# Altium footprint library ParsaLibrary.PcbLib: 526 footprints (part 19 of 33)
Each footprint in its own frame and in the unit in brackets; x right, y up, seen from the top. Pads: shape width x height; smd on the part's side, far side on the other; paste and mask are expansions set on the pad; w line width, h text height; cw(c..) or ccw(c..) is an arc to the next point about the centre after c.
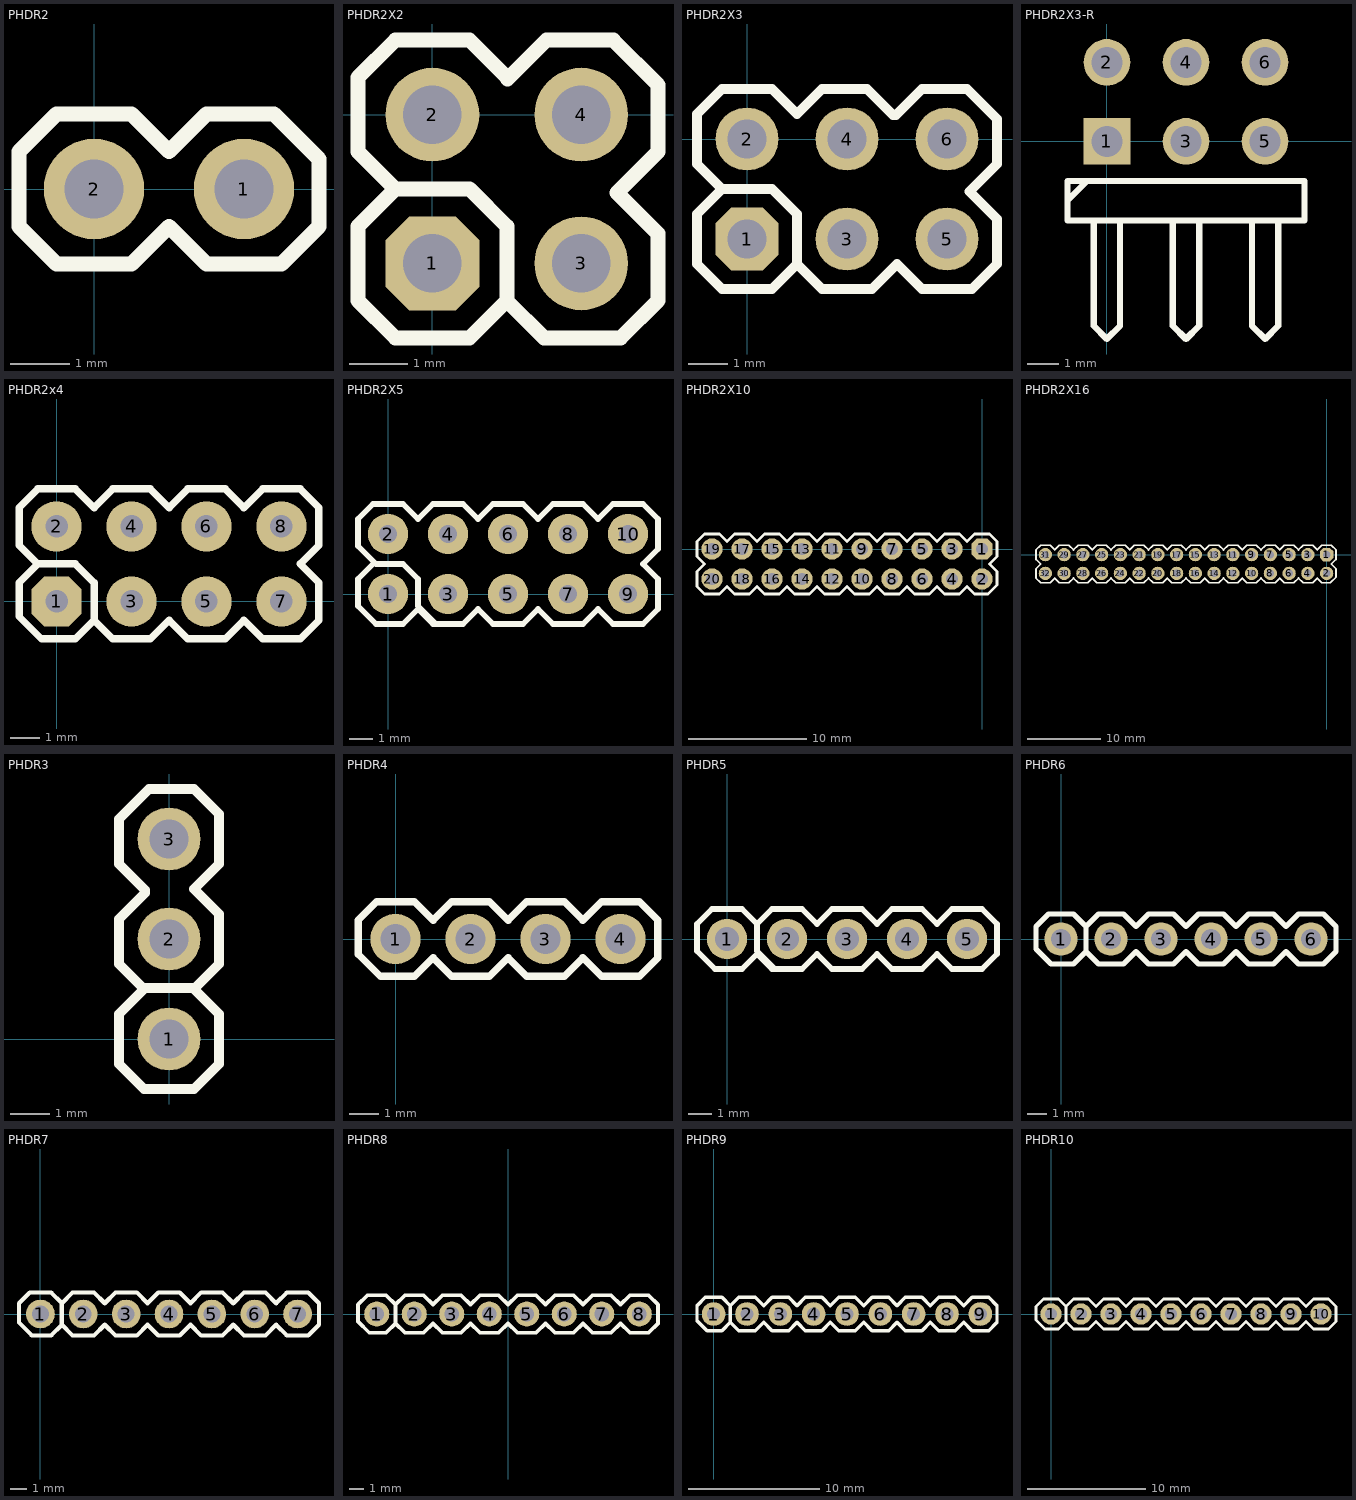
[diagram p18: the footprints below, top view; thin cyan lines are the x and y axes]

## PHDR2 [mm] "Pin Header 2 M"
pads (2):
  round 1.7 hole 1: 1(2.54,0) 2(0,0)
Top Overlay:
  lines w0.254: -1.27,-0.635 -1.27,0.635 -0.635,1.27 0,1.27 0.635,1.27 1.27,0.635 1.905,1.27 3.048,1.27 3.81,0.508 3.81,-0.635 3.175,-1.27 1.905,-1.27 1.27,-0.635 0.635,-1.27 -0.635,-1.27 -1.27,-0.635
3D body "jumper.STEP": height 8.39, standoff -2.53, extent -1.244,-1.295 3.836,1.245

## PHDR2X2 [mm]
pads (4):
  oct 1.6x1.6 hole 1: 1(0,-2.54)
  round 1.6 hole 1: 2(0,0) 3(2.54,-2.54) 4(2.54,0)
Top Overlay:
  lines w0.254: 1.27,0.635 0.635,1.27 0,1.27 -0.635,1.27 -1.27,0.635 -1.27,-0.635 -0.635,-1.27 ; 1.285,0.61 1.945,1.27 3.088,1.27 3.85,0.508 3.85,-0.635 3.151,-1.333 3.85,-2.032 3.85,-3.175 3.215,-3.81 1.945,-3.81 ; 1.905,-3.81 1.27,-3.175 ; -0.635,-1.27 -1.27,-1.905 -1.27,-3.175 -0.635,-3.81 0.635,-3.81 1.27,-3.175 ; -0.635,-1.27 0.635,-1.27 1.27,-1.905 1.27,-3.175
3D body "jumper.STEP": height 8.39, standoff -2.53, extent -1.27,-3.81 1.27,1.27
3D body "jumper.STEP": height 8.39, standoff -2.53, extent 1.27,-3.81 3.81,1.27

## PHDR2X3 [mm]
pads (6):
  oct 1.6x1.6 hole 1: 1(0,-2.54)
  round 1.6 hole 1: 2(0,0) 3(2.54,-2.54) 4(2.54,0) 5(5.08,-2.54) 6(5.08,0)
Top Overlay:
  lines w0.254: -0.635,-1.27 -1.27,-0.635 -1.27,0.635 -0.635,1.27 0,1.27 0.635,1.27 1.27,0.635 1.905,1.27 3.048,1.27 3.708,0.61 3.785,0.61 4.445,1.27 5.588,1.27 6.35,0.508 6.35,-0.635 5.651,-1.333 6.35,-2.032 6.35,-3.175 5.715,-3.81 4.445,-3.81 3.81,-3.175 3.175,-3.81 1.905,-3.81 1.27,-3.175 ; -0.635,-1.27 -1.27,-1.905 -1.27,-3.175 -0.635,-3.81 0.635,-3.81 1.27,-3.175 ; -0.635,-1.27 0.635,-1.27 1.27,-1.905 1.27,-3.175
3D body "jumper.STEP": height 8.39, standoff -2.53, extent -1.27,-3.81 1.27,1.27
3D body "jumper.STEP": height 8.39, standoff -2.53, extent 1.27,-3.81 3.81,1.27
3D body "jumper.STEP": height 8.39, standoff -2.53, extent 3.81,-3.81 6.35,1.27

## PHDR2X3-R [mm]
pads (6):
  rect 1.5x1.5 hole 1: 1(0,0)
  round 1.5 hole 1: 2(0,2.54) 3(2.54,0) 4(2.54,2.54) 5(5.08,0) 6(5.08,2.54)
Top Overlay:
  lines w0.2: -1.27,-1.905 -0.635,-1.27 ; -0.423,-2.54 -0.423,-5.927 0,-6.35 0.423,-5.927 0.423,-2.54 ; 2.117,-2.54 2.117,-5.927 2.54,-6.35 2.963,-5.927 2.963,-2.54 ; 4.657,-2.54 4.657,-5.927 5.08,-6.35 5.503,-5.927 5.503,-2.54 ; -1.27,-2.54 -1.27,-1.27 6.35,-1.27 6.35,-2.54 -1.27,-2.54
3D body "12544.stp": height 5.55, standoff -3.2, extent -1.27,-9.61 6.35,2.845

## PHDR2x4 [mm]
pads (8):
  oct 1.7x1.7 hole 0.762: 1(0,0)
  round 1.7 hole 0.762: 2(0,2.54) 3(2.54,0) 4(2.54,2.54) 5(5.08,0) 6(5.08,2.54) 7(7.62,0) 8(7.62,2.54)
Top Overlay:
  lines w0.254: -0.635,1.27 0.635,1.27 1.27,0.635 1.27,-0.635 ; -0.635,1.27 -1.27,0.635 -1.27,-0.508 -0.508,-1.27 0.635,-1.27 1.27,-0.635 ; -0.635,1.27 -1.27,1.905 -1.27,3.175 -0.635,3.81 0.635,3.81 1.27,3.175 1.905,3.81 3.175,3.81 3.81,3.175 4.445,3.81 5.715,3.81 6.35,3.175 6.985,3.81 8.255,3.81 8.89,3.175 8.89,1.905 8.255,1.27 8.89,0.635 8.89,-0.635 8.255,-1.27 7.62,-1.27 6.985,-1.27 6.35,-0.635 5.715,-1.27 5.08,-1.27 4.445,-1.27 3.81,-0.635 3.175,-1.27 2.54,-1.27 1.905,-1.27 1.27,-0.635
3D body "2pinheader.STEP": height 8.38, standoff -2.54, extent -1.27,-1.27 3.81,1.27
3D body "2pinheader.STEP": height 8.38, standoff -2.54, extent 3.81,-1.27 8.89,1.27
3D body "2pinheader.STEP": height 8.38, standoff -2.54, extent 3.81,1.27 8.89,3.81
3D body "2pinheader.STEP": height 8.38, standoff -2.54, extent -1.27,1.27 3.81,3.81

## PHDR2X5 [mm]
pads (10):
  round 1.7 hole 0.762: 1(0,0) 2(0,2.54) 3(2.54,0) 4(2.54,2.54) 5(5.08,0) 6(5.08,2.54) 7(7.62,0) 8(7.62,2.54) 9(10.16,0) 10(10.16,2.54)
Top Overlay:
  lines w0.254: -0.635,1.27 -1.27,0.635 -1.27,-0.508 -0.508,-1.27 0.635,-1.27 1.27,-0.635 1.905,-1.27 2.54,-1.27 3.175,-1.27 ; 1.27,3.175 0.635,3.81 -0.635,3.81 -1.27,3.175 -1.27,2.032 -0.508,1.27 0.635,1.27 1.27,0.635 1.27,-0.508 2.032,-1.27 3.175,-1.27 ; 1.27,3.175 1.905,3.81 ; 1.27,3.175 1.905,3.81 ; 1.905,3.81 3.175,3.81 ; 1.905,3.81 3.175,3.81 ; 3.175,-1.27 3.81,-0.635 ; 3.175,-1.27 3.81,-0.635 ; 3.175,3.81 3.81,3.175 ; 3.175,3.81 3.81,3.175 ; 3.81,-0.635 4.445,-1.27 ; 3.81,-0.635 4.445,-1.27 ; 3.81,3.175 4.445,3.81 ; 3.81,3.175 4.445,3.81 ; 4.445,-1.27 5.08,-1.27 5.715,-1.27 ; 4.445,3.81 5.715,3.81 ; 5.715,-1.27 6.35,-0.635 ; 5.715,-1.27 6.35,-0.635 ; 5.715,3.81 6.35,3.175 ; 5.715,3.81 6.35,3.175 ; 6.35,-0.635 6.985,-1.27 ; 6.35,-0.635 6.985,-1.27 ; 6.35,3.175 6.985,3.81 ; 6.35,3.175 6.985,3.81 ; 6.985,-1.27 7.62,-1.27 ; 6.985,-1.27 7.62,-1.27 ; 6.985,3.81 8.255,3.81 ; 6.985,3.81 8.255,3.81 ; 7.62,-1.27 8.255,-1.27 ; 7.62,-1.27 8.255,-1.27 ; 8.255,-1.27 8.89,-0.635 ; 8.255,-1.27 8.89,-0.635 ; 8.255,3.81 8.89,3.175 ; 8.255,3.81 8.89,3.175 ; 8.89,-0.635 9.525,-1.27 10.16,-1.27 10.795,-1.27 11.43,-0.635 11.43,0.635 10.795,1.27 11.43,1.905 11.43,3.175 10.795,3.81 9.525,3.81 8.89,3.175
3D body "2pinheader.STEP": height 8.38, standoff -2.54, extent -1.27,-1.27 1.27,3.81
3D body "2pinheader.STEP": height 8.38, standoff -2.54, extent 1.27,-1.27 3.81,3.81
3D body "2pinheader.STEP": height 8.38, standoff -2.54, extent 3.81,-1.27 6.35,3.81
3D body "2pinheader.STEP": height 8.38, standoff -2.54, extent 6.35,-1.27 8.89,3.81
3D body "2pinheader.STEP": height 8.38, standoff -2.54, extent 8.89,-1.27 11.43,3.81

## PHDR2X10 [mm]
pads (20):
  oct 1.8x1.8 hole 1: 1(0,0)
  round 1.8 hole 1: 2(0,-2.54) 3(-2.54,0) 4(-2.54,-2.54) 5(-5.08,0) 6(-5.08,-2.54) 7(-7.62,0) 8(-7.62,-2.54) 9(-10.16,0) 10(-10.16,-2.54) 11(-12.7,0) 12(-12.7,-2.54) 13(-15.24,0) 14(-15.24,-2.54) 15(-17.78,0) 16(-17.78,-2.54) 17(-20.32,0) 18(-20.32,-2.54) 19(-22.86,0) 20(-22.86,-2.54)
Top Overlay:
  lines w0.254: -15.24,-3.81 -14.605,-3.81 -13.97,-3.175 -13.335,-3.81 -12.7,-3.81 ; -14.732,-3.81 -15.875,-3.81 -16.51,-3.175 -17.145,-3.81 -17.78,-3.81 ; -5.08,-3.81 -4.445,-3.81 -3.81,-3.175 -3.175,-3.81 -2.54,-3.81 -1.905,-3.81 -1.27,-3.175 -0.635,-3.81 0.508,-3.81 1.27,-3.048 1.27,-1.905 0.635,-1.27 1.27,-0.635 1.27,0.635 0.635,1.27 -0.635,1.27 -1.27,0.635 -1.905,1.27 -3.175,1.27 -3.81,0.635 -4.445,1.27 -5.715,1.27 -6.35,0.635 -6.985,1.27 -8.255,1.27 -8.89,0.635 -9.525,1.27 -10.795,1.27 -11.43,0.635 -12.065,1.27 -13.335,1.27 -13.97,0.635 -14.605,1.27 -15.875,1.27 -16.51,0.635 -17.145,1.27 -18.415,1.27 -19.05,0.635 -19.685,1.27 -20.955,1.27 -21.59,0.635 -22.225,1.27 -23.495,1.27 -24.13,0.635 -24.13,-0.635 -23.495,-1.27 -24.13,-1.905 -24.13,-3.175 -23.495,-3.81 -22.86,-3.81 -22.225,-3.81 -21.59,-3.175 -20.955,-3.81 -20.32,-3.81 -19.685,-3.81 -19.05,-3.175 -18.415,-3.81 ; -4.572,-3.81 -5.715,-3.81 -6.35,-3.175 -6.985,-3.81 -7.62,-3.81 ; -18.415,-3.81 -17.78,-3.81 ; -18.415,-3.81 -17.78,-3.81 ; -12.7,-3.81 -12.065,-3.81 ; -12.7,-3.81 -12.065,-3.81 ; -12.065,-3.81 -11.43,-3.175 -10.795,-3.81 -10.16,-3.81 -9.525,-3.81 -8.89,-3.175 -8.255,-3.81 ; -8.255,-3.81 -7.62,-3.81 ; -8.255,-3.81 -7.62,-3.81
3D body "2pinheader.STEP": height 2.54, standoff -8.38, extent -24.13,-3.81 -19.05,-1.27
3D body "2pinheader.STEP": height 2.54, standoff -8.38, extent -19.05,-3.81 -13.97,-1.27
3D body "2pinheader.STEP": height 2.54, standoff -8.38, extent -13.97,-3.81 -8.89,-1.27
3D body "2pinheader.STEP": height 2.54, standoff -8.38, extent -8.89,-3.81 -3.81,-1.27
3D body "2pinheader.STEP": height 2.54, standoff -8.38, extent -3.81,-3.81 1.27,-1.27
3D body "2pinheader.STEP": height 2.54, standoff -8.38, extent -3.81,-1.27 1.27,1.27
3D body "2pinheader.STEP": height 2.54, standoff -8.38, extent -8.89,-1.27 -3.81,1.27
3D body "2pinheader.STEP": height 2.54, standoff -8.38, extent -13.97,-1.27 -8.89,1.27
3D body "2pinheader.STEP": height 2.54, standoff -8.38, extent -19.05,-1.27 -13.97,1.27
3D body "2pinheader.STEP": height 2.54, standoff -8.38, extent -24.13,-1.27 -19.05,1.27

## PHDR2X16 [mm]
pads (32):
  oct 1.8x1.8 hole 1: 1(0,0)
  round 1.8 hole 1: 2(0,-2.54) 3(-2.54,0) 4(-2.54,-2.54) 5(-5.08,0) 6(-5.08,-2.54) 7(-7.62,0) 8(-7.62,-2.54) 9(-10.16,0) 10(-10.16,-2.54) 11(-12.7,0) 12(-12.7,-2.54) 13(-15.24,0) 14(-15.24,-2.54) 15(-17.78,0) 16(-17.78,-2.54) 17(-20.32,0) 18(-20.32,-2.54) 19(-22.86,0) 20(-22.86,-2.54) 21(-25.4,0) 22(-25.4,-2.54) 23(-27.94,0) 24(-27.94,-2.54) 25(-30.48,0) 26(-30.48,-2.54) 27(-33.02,0) 28(-33.02,-2.54) 29(-35.56,0) 30(-35.56,-2.54) 31(-38.1,0) 32(-38.1,-2.54)
Top Overlay:
  lines w0.254: -15.24,-3.81 -14.605,-3.81 -13.97,-3.175 -13.335,-3.81 -12.7,-3.81 ; -14.732,-3.81 -15.875,-3.81 -16.51,-3.175 -17.145,-3.81 -17.78,-3.81 ; -5.08,-3.81 -4.445,-3.81 -3.81,-3.175 -3.175,-3.81 -2.54,-3.81 -1.905,-3.81 -1.27,-3.175 -0.635,-3.81 0.508,-3.81 1.27,-3.048 1.27,-1.905 0.635,-1.27 1.27,-0.635 1.27,0.635 0.635,1.27 -0.635,1.27 -1.27,0.635 -1.905,1.27 -3.175,1.27 -3.81,0.635 -4.445,1.27 -5.715,1.27 -6.35,0.635 -6.985,1.27 -8.255,1.27 -8.89,0.635 -9.525,1.27 -10.795,1.27 -11.43,0.635 -12.065,1.27 -13.335,1.27 -13.97,0.635 -14.605,1.27 -15.875,1.27 -16.51,0.635 -17.145,1.27 -18.415,1.27 -19.05,0.635 -19.685,1.27 -20.955,1.27 -21.59,0.635 -22.225,1.27 -23.495,1.27 ; -4.572,-3.81 -5.715,-3.81 -6.35,-3.175 -6.985,-3.81 -7.62,-3.81 ; -26.67,-3.175 -27.305,-3.81 -27.94,-3.81 -28.575,-3.81 -29.21,-3.175 -29.845,-3.81 -30.48,-3.81 -31.115,-3.81 -31.75,-3.175 -32.385,-3.81 -33.02,-3.81 -33.655,-3.81 -34.29,-3.175 -34.925,-3.81 -35.56,-3.81 -36.195,-3.81 -36.83,-3.175 -37.465,-3.81 -38.1,-3.81 -38.735,-3.81 -39.37,-3.175 -39.37,-1.905 -38.735,-1.27 -39.37,-0.635 -39.37,0.635 -38.735,1.27 -37.465,1.27 -36.83,0.635 -36.195,1.27 -34.925,1.27 -34.29,0.635 -33.655,1.27 -32.385,1.27 -31.75,0.635 -31.115,1.27 -29.845,1.27 -29.21,0.635 -28.575,1.27 -27.305,1.27 -26.67,0.635 ; -26.67,-3.175 -26.035,-3.81 ; -26.67,-3.175 -26.035,-3.81 ; -26.67,0.635 -26.035,1.27 ; -26.67,0.635 -26.035,1.27 ; -26.035,-3.81 -25.4,-3.81 -24.765,-3.81 -24.13,-3.175 ; -26.035,1.27 -24.765,1.27 -24.13,0.635 ; -24.13,-3.175 -23.495,-3.81 ; -24.13,-3.175 -23.495,-3.81 ; -24.13,0.635 -23.495,1.27 ; -24.13,0.635 -23.495,1.27 ; -23.495,-3.81 -22.86,-3.81 -22.225,-3.81 -21.59,-3.175 -20.955,-3.81 -20.32,-3.81 -19.685,-3.81 -19.05,-3.175 -18.415,-3.81 ; -18.415,-3.81 -17.78,-3.81 ; -18.415,-3.81 -17.78,-3.81 ; -12.7,-3.81 -12.065,-3.81 ; -12.7,-3.81 -12.065,-3.81 ; -12.065,-3.81 -11.43,-3.175 -10.795,-3.81 -10.16,-3.81 -9.525,-3.81 -8.89,-3.175 -8.255,-3.81 ; -8.255,-3.81 -7.62,-3.81 ; -8.255,-3.81 -7.62,-3.81
3D body "2pinheader.STEP": height 2.54, standoff -8.38, extent -24.13,-1.27 -19.05,1.27
3D body "2pinheader.STEP": height 2.54, standoff -8.38, extent -19.05,-1.27 -13.97,1.27
3D body "2pinheader.STEP": height 2.54, standoff -8.38, extent -13.97,-1.27 -8.89,1.27
3D body "2pinheader.STEP": height 2.54, standoff -8.38, extent -8.89,-1.27 -3.81,1.27
3D body "2pinheader.STEP": height 2.54, standoff -8.38, extent -3.81,-1.27 1.27,1.27
3D body "2pinheader.STEP": height 2.54, standoff -8.38, extent -3.81,-3.81 1.27,-1.27
3D body "2pinheader.STEP": height 2.54, standoff -8.38, extent -8.89,-3.81 -3.81,-1.27
3D body "2pinheader.STEP": height 2.54, standoff -8.38, extent -13.97,-3.81 -8.89,-1.27
3D body "2pinheader.STEP": height 2.54, standoff -8.38, extent -19.05,-3.81 -13.97,-1.27
3D body "2pinheader.STEP": height 2.54, standoff -8.38, extent -24.13,-3.81 -19.05,-1.27
3D body "2pinheader.STEP": height 2.54, standoff -8.38, extent -29.21,-3.81 -24.13,-1.27
3D body "2pinheader.STEP": height 2.54, standoff -8.38, extent -29.21,-1.27 -24.13,1.27
3D body "2pinheader.STEP": height 2.54, standoff -8.38, extent -34.29,-3.81 -29.21,-1.27
3D body "2pinheader.STEP": height 2.54, standoff -8.38, extent -34.29,-1.27 -29.21,1.27
3D body "2pinheader.STEP": height 2.54, standoff -8.38, extent -39.37,-3.81 -34.29,-1.27
3D body "2pinheader.STEP": height 2.54, standoff -8.38, extent -39.37,-1.27 -34.29,1.27

## PHDR3 [mm]
pads (3):
  round 1.6 hole 1: 1(0,0) 2(0,2.54) 3(0,5.08)
Top Overlay:
  lines w0.254: -0.61,1.295 0.66,1.295 ; -1.27,-0.635 -1.27,0 -1.27,0.635 -0.635,1.27 -1.27,1.905 -1.27,3.048 -0.61,3.708 -0.61,3.785 -1.27,4.445 -1.27,5.588 -0.508,6.35 0.635,6.35 1.27,5.715 1.27,4.445 0.635,3.81 1.27,3.175 1.27,1.905 0.635,1.27 1.27,0.635 1.27,-0.635 0.635,-1.27 -0.635,-1.27 -1.27,-0.635
3D body "jumper.STEP": height 8.39, standoff -2.53, extent -1.27,-1.27 1.27,3.81
3D body "jumper.STEP": height 8.39, standoff -2.53, extent -1.27,1.27 1.27,6.35

## PHDR4 [mm]
pads (4):
  round 1.7 hole 1: 1(0,0) 2(2.54,0) 3(5.08,0) 4(7.62,0)
Top Overlay:
  lines w0.254: -1.27,-0.508 -1.27,0.635 -0.635,1.27 0.635,1.27 1.27,0.635 1.905,1.27 3.175,1.27 3.81,0.635 4.445,1.27 5.715,1.27 6.35,0.635 6.985,1.27 8.255,1.27 8.89,0.635 8.89,-0.635 8.255,-1.27 7.62,-1.27 6.985,-1.27 6.35,-0.635 5.715,-1.27 5.08,-1.27 4.445,-1.27 3.81,-0.635 3.175,-1.27 2.54,-1.27 1.905,-1.27 1.27,-0.635 0.635,-1.27 -0.508,-1.27 -1.27,-0.508
3D body "2pinheader.STEP": height 8.38, standoff -2.54, extent -1.27,-1.27 3.81,1.27
3D body "2pinheader.STEP": height 8.38, standoff -2.54, extent 3.81,-1.27 8.89,1.27

## PHDR5 [mm]
pads (5):
  round 1.7 hole 1: 1(0,0) 2(2.54,0) 3(5.08,0) 4(7.62,0) 5(10.16,0)
Top Overlay:
  lines w0.254: 1.27,0.635 0.635,1.27 -0.635,1.27 -1.27,0.635 -1.27,-0.508 -0.508,-1.27 0.635,-1.27 1.27,-0.635 1.905,-1.27 2.54,-1.27 3.175,-1.27 ; 1.27,0.635 1.905,1.27 ; 1.27,0.635 1.27,-0.508 2.032,-1.27 3.175,-1.27 ; 1.27,0.635 1.905,1.27 ; 1.905,1.27 3.175,1.27 ; 1.905,1.27 3.175,1.27 ; 3.175,-1.27 3.81,-0.635 ; 3.175,-1.27 3.81,-0.635 ; 3.175,1.27 3.81,0.635 ; 3.175,1.27 3.81,0.635 ; 3.81,-0.635 4.445,-1.27 ; 3.81,-0.635 4.445,-1.27 ; 3.81,0.635 4.445,1.27 ; 3.81,0.635 4.445,1.27 ; 4.445,-1.27 5.08,-1.27 5.715,-1.27 ; 4.445,1.27 5.715,1.27 ; 5.715,-1.27 6.35,-0.635 ; 5.715,-1.27 6.35,-0.635 ; 5.715,1.27 6.35,0.635 ; 5.715,1.27 6.35,0.635 ; 6.35,-0.635 6.985,-1.27 ; 6.35,-0.635 6.985,-1.27 ; 6.35,0.635 6.985,1.27 ; 6.35,0.635 6.985,1.27 ; 6.985,-1.27 7.62,-1.27 ; 6.985,-1.27 7.62,-1.27 ; 6.985,1.27 8.255,1.27 ; 6.985,1.27 8.255,1.27 ; 7.62,-1.27 8.255,-1.27 ; 7.62,-1.27 8.255,-1.27 ; 8.255,-1.27 8.89,-0.635 ; 8.255,-1.27 8.89,-0.635 ; 8.255,1.27 8.89,0.635 ; 8.255,1.27 8.89,0.635 ; 8.89,-0.635 9.525,-1.27 10.16,-1.27 10.795,-1.27 11.43,-0.635 11.43,0.635 10.795,1.27 9.525,1.27 8.89,0.635

## PHDR6 [mm]
pads (6):
  round 1.7 hole 1: 1(0,0) 2(2.54,0) 3(5.08,0) 4(7.62,0) 5(10.16,0) 6(12.7,0)
Top Overlay:
  lines w0.254: 4.572,-1.27 5.715,-1.27 6.35,-0.635 6.985,-1.27 7.62,-1.27 ; 5.08,-1.27 4.445,-1.27 3.81,-0.635 3.175,-1.27 2.54,-1.27 1.905,-1.27 1.27,-0.635 ; 1.27,-0.635 1.27,0.635 ; 1.27,-0.635 0.635,-1.27 -0.508,-1.27 -1.27,-0.508 -1.27,0.635 -0.635,1.27 0.635,1.27 1.27,0.635 ; 1.27,0.635 1.905,1.27 3.175,1.27 3.81,0.635 4.445,1.27 5.715,1.27 6.35,0.635 6.985,1.27 8.255,1.27 8.89,0.635 9.525,1.27 10.795,1.27 11.43,0.635 12.065,1.27 13.335,1.27 13.97,0.635 13.97,-0.635 13.335,-1.27 12.7,-1.27 12.065,-1.27 11.43,-0.635 10.795,-1.27 10.16,-1.27 9.525,-1.27 8.89,-0.635 8.255,-1.27 ; 7.62,-1.27 8.255,-1.27 ; 7.62,-1.27 8.255,-1.27
3D body "2pinheader.STEP": height 8.38, standoff -2.54, extent -1.27,-1.27 3.81,1.27
3D body "2pinheader.STEP": height 8.38, standoff -2.54, extent 3.81,-1.27 8.89,1.27
3D body "2pinheader.STEP": height 8.38, standoff -2.54, extent 8.89,-1.27 13.97,1.27

## PHDR7 [mm]
pads (7):
  round 1.7 hole 1: 1(0,0) 2(2.54,0) 3(5.08,0) 4(7.62,0) 5(10.16,0) 6(12.7,0) 7(15.24,0)
Top Overlay:
  lines w0.254: 4.572,-1.27 5.715,-1.27 6.35,-0.635 6.985,-1.27 7.62,-1.27 ; 5.08,-1.27 4.445,-1.27 3.81,-0.635 3.175,-1.27 2.54,-1.27 1.905,-1.27 1.27,-0.635 ; 1.27,-0.635 0.635,-1.27 -0.508,-1.27 -1.27,-0.508 -1.27,0.635 -0.635,1.27 0.635,1.27 1.27,0.635 ; 1.27,-0.635 1.27,0.635 ; 1.27,0.635 1.905,1.27 3.175,1.27 3.81,0.635 4.445,1.27 5.715,1.27 6.35,0.635 6.985,1.27 8.255,1.27 8.89,0.635 9.525,1.27 10.795,1.27 11.43,0.635 12.065,1.27 13.335,1.27 13.97,0.635 14.605,1.27 15.875,1.27 16.51,0.635 16.51,-0.635 15.875,-1.27 15.24,-1.27 14.605,-1.27 13.97,-0.635 13.335,-1.27 12.7,-1.27 12.065,-1.27 11.43,-0.635 10.795,-1.27 10.16,-1.27 9.525,-1.27 8.89,-0.635 8.255,-1.27 ; 7.62,-1.27 8.255,-1.27 ; 7.62,-1.27 8.255,-1.27
3D body "2pinheader.STEP": height 8.38, standoff -2.54, extent 11.43,-1.27 16.51,1.27
3D body "2pinheader.STEP": height 8.38, standoff -2.54, extent 8.89,-1.27 13.97,1.27
3D body "2pinheader.STEP": height 8.38, standoff -2.54, extent 3.81,-1.27 8.89,1.27
3D body "2pinheader.STEP": height 8.38, standoff -2.54, extent -1.27,-1.27 3.81,1.27

## PHDR8 [mm]
pads (8):
  round 1.7 hole 1: 1(-8.89,0) 2(-6.35,0) 3(-3.81,0) 4(-1.27,0) 5(1.27,0) 6(3.81,0) 7(6.35,0) 8(8.89,0)
Top Overlay:
  lines w0.254: -4.318,-1.27 -3.175,-1.27 -2.54,-0.635 -1.905,-1.27 -1.27,-1.27 ; -3.81,-1.27 -4.445,-1.27 -5.08,-0.635 -5.715,-1.27 -6.35,-1.27 -6.985,-1.27 -7.62,-0.635 ; 5.842,-1.27 6.985,-1.27 7.62,-0.635 8.255,-1.27 8.89,-1.27 ; 6.35,-1.27 5.715,-1.27 5.08,-0.635 4.445,-1.27 3.81,-1.27 ; -7.62,-0.635 -7.62,0.635 ; -7.62,-0.635 -8.255,-1.27 -9.398,-1.27 -10.16,-0.508 -10.16,0.635 -9.525,1.27 -8.255,1.27 -7.62,0.635 ; -7.62,0.635 -6.985,1.27 -5.715,1.27 -5.08,0.635 -4.445,1.27 -3.175,1.27 -2.54,0.635 -1.905,1.27 -0.635,1.27 0,0.635 0.635,1.27 1.905,1.27 2.54,0.635 3.175,1.27 4.445,1.27 5.08,0.635 5.715,1.27 6.985,1.27 7.62,0.635 8.255,1.27 9.525,1.27 10.16,0.635 10.16,-0.635 9.525,-1.27 ; -1.27,-1.27 -0.635,-1.27 ; -1.27,-1.27 -0.635,-1.27 ; -0.635,-1.27 0,-0.635 0.635,-1.27 1.27,-1.27 1.905,-1.27 2.54,-0.635 3.175,-1.27 ; 3.175,-1.27 3.81,-1.27 ; 3.175,-1.27 3.81,-1.27 ; 8.89,-1.27 9.525,-1.27 ; 8.89,-1.27 9.525,-1.27
3D body "2pinheader.STEP": height 8.38, standoff -2.54, extent 5.05,-1.24 10.13,1.3
3D body "2pinheader.STEP": height 8.38, standoff -2.54, extent -0.03,-1.24 5.05,1.3
3D body "2pinheader.STEP": height 8.38, standoff -2.54, extent -5.11,-1.24 -0.03,1.3
3D body "2pinheader.STEP": height 8.38, standoff -2.54, extent -10.19,-1.24 -5.11,1.3

## PHDR9 [mm]
pads (9):
  round 1.8 hole 1: 1(0,0) 2(2.54,0) 3(5.08,0) 4(7.62,0) 5(10.16,0) 6(12.7,0) 7(15.24,0) 8(17.78,0) 9(20.32,0)
Top Overlay:
  lines w0.254: 4.572,-1.27 5.715,-1.27 6.35,-0.635 6.985,-1.27 7.62,-1.27 ; 5.08,-1.27 4.445,-1.27 3.81,-0.635 3.175,-1.27 2.54,-1.27 1.905,-1.27 1.27,-0.635 ; 14.732,-1.27 15.875,-1.27 16.51,-0.635 17.145,-1.27 17.78,-1.27 ; 15.24,-1.27 14.605,-1.27 13.97,-0.635 13.335,-1.27 12.7,-1.27 ; 1.27,-0.635 1.27,0.635 ; 1.27,-0.635 0.635,-1.27 -0.508,-1.27 -1.27,-0.508 -1.27,0.635 -0.635,1.27 0.635,1.27 1.27,0.635 ; 1.27,0.635 1.905,1.27 3.175,1.27 3.81,0.635 4.445,1.27 5.715,1.27 6.35,0.635 6.985,1.27 8.255,1.27 8.89,0.635 9.525,1.27 10.795,1.27 11.43,0.635 12.065,1.27 13.335,1.27 13.97,0.635 14.605,1.27 15.875,1.27 16.51,0.635 17.145,1.27 18.415,1.27 19.05,0.635 19.685,1.27 20.955,1.27 21.59,0.635 21.59,-0.635 20.955,-1.27 20.32,-1.27 19.685,-1.27 19.05,-0.635 18.415,-1.27 ; 7.62,-1.27 8.255,-1.27 ; 7.62,-1.27 8.255,-1.27 ; 8.255,-1.27 8.89,-0.635 9.525,-1.27 10.16,-1.27 10.795,-1.27 11.43,-0.635 12.065,-1.27 ; 12.065,-1.27 12.7,-1.27 ; 12.065,-1.27 12.7,-1.27 ; 17.78,-1.27 18.415,-1.27 ; 17.78,-1.27 18.415,-1.27
3D body "2pinheader.STEP": height 2.54, standoff -8.38, extent -1.27,-1.27 3.81,1.27
3D body "2pinheader.STEP": height 2.54, standoff -8.38, extent 3.81,-1.27 8.89,1.27
3D body "2pinheader.STEP": height 2.54, standoff -8.38, extent 8.89,-1.27 13.97,1.27
3D body "2pinheader.STEP": height 2.54, standoff -8.38, extent 13.97,-1.27 19.05,1.27
3D body "2pinheader.STEP": height 2.54, standoff -8.38, extent 16.51,-1.27 21.59,1.27

## PHDR10 [mm]
pads (10):
  round 1.8 hole 1: 1(0,0) 2(2.54,0) 3(5.08,0) 4(7.62,0) 5(10.16,0) 6(12.7,0) 7(15.24,0) 8(17.78,0) 9(20.32,0) 10(22.86,0)
Top Overlay:
  lines w0.254: 4.572,-1.27 5.715,-1.27 6.35,-0.635 6.985,-1.27 7.62,-1.27 ; 5.08,-1.27 4.445,-1.27 3.81,-0.635 3.175,-1.27 2.54,-1.27 1.905,-1.27 1.27,-0.635 ; 14.732,-1.27 15.875,-1.27 16.51,-0.635 17.145,-1.27 17.78,-1.27 ; 15.24,-1.27 14.605,-1.27 13.97,-0.635 13.335,-1.27 12.7,-1.27 ; 1.27,-0.635 1.27,0.635 ; 1.27,-0.635 0.635,-1.27 -0.508,-1.27 -1.27,-0.508 -1.27,0.635 -0.635,1.27 0.635,1.27 1.27,0.635 ; 1.27,0.635 1.905,1.27 3.175,1.27 3.81,0.635 4.445,1.27 5.715,1.27 6.35,0.635 6.985,1.27 8.255,1.27 8.89,0.635 9.525,1.27 10.795,1.27 11.43,0.635 12.065,1.27 13.335,1.27 13.97,0.635 14.605,1.27 15.875,1.27 16.51,0.635 17.145,1.27 18.415,1.27 19.05,0.635 19.685,1.27 20.955,1.27 21.59,0.635 22.225,1.27 23.495,1.27 24.13,0.635 24.13,-0.635 23.495,-1.27 22.86,-1.27 22.225,-1.27 21.59,-0.635 20.955,-1.27 20.32,-1.27 19.685,-1.27 19.05,-0.635 18.415,-1.27 ; 7.62,-1.27 8.255,-1.27 ; 7.62,-1.27 8.255,-1.27 ; 8.255,-1.27 8.89,-0.635 9.525,-1.27 10.16,-1.27 10.795,-1.27 11.43,-0.635 12.065,-1.27 ; 12.065,-1.27 12.7,-1.27 ; 12.065,-1.27 12.7,-1.27 ; 17.78,-1.27 18.415,-1.27 ; 17.78,-1.27 18.415,-1.27
3D body "2pinheader.STEP": height 0.74, standoff -10.18, extent -1.27,-1.27 3.81,1.27
3D body "2pinheader.STEP": height 0.84, standoff -10.08, extent 3.81,-1.27 8.89,1.27
3D body "2pinheader.STEP": height 0.84, standoff -10.08, extent 8.89,-1.27 13.97,1.27
3D body "2pinheader.STEP": height 0.84, standoff -10.08, extent 13.97,-1.27 19.05,1.27
3D body "2pinheader.STEP": height 0.84, standoff -10.08, extent 19.05,-1.27 24.13,1.27